# Altium footprint library Intelliclone.PcbLib: 372 footprints (part 1 of 24)
Each footprint in its own frame and in the unit in brackets; x right, y up, seen from the top. Pads: shape width x height; smd on the part's side, far side on the other; paste and mask are expansions set on the pad; w line width, h text height; cw(c..) or ccw(c..) is an arc to the next point about the centre after c.
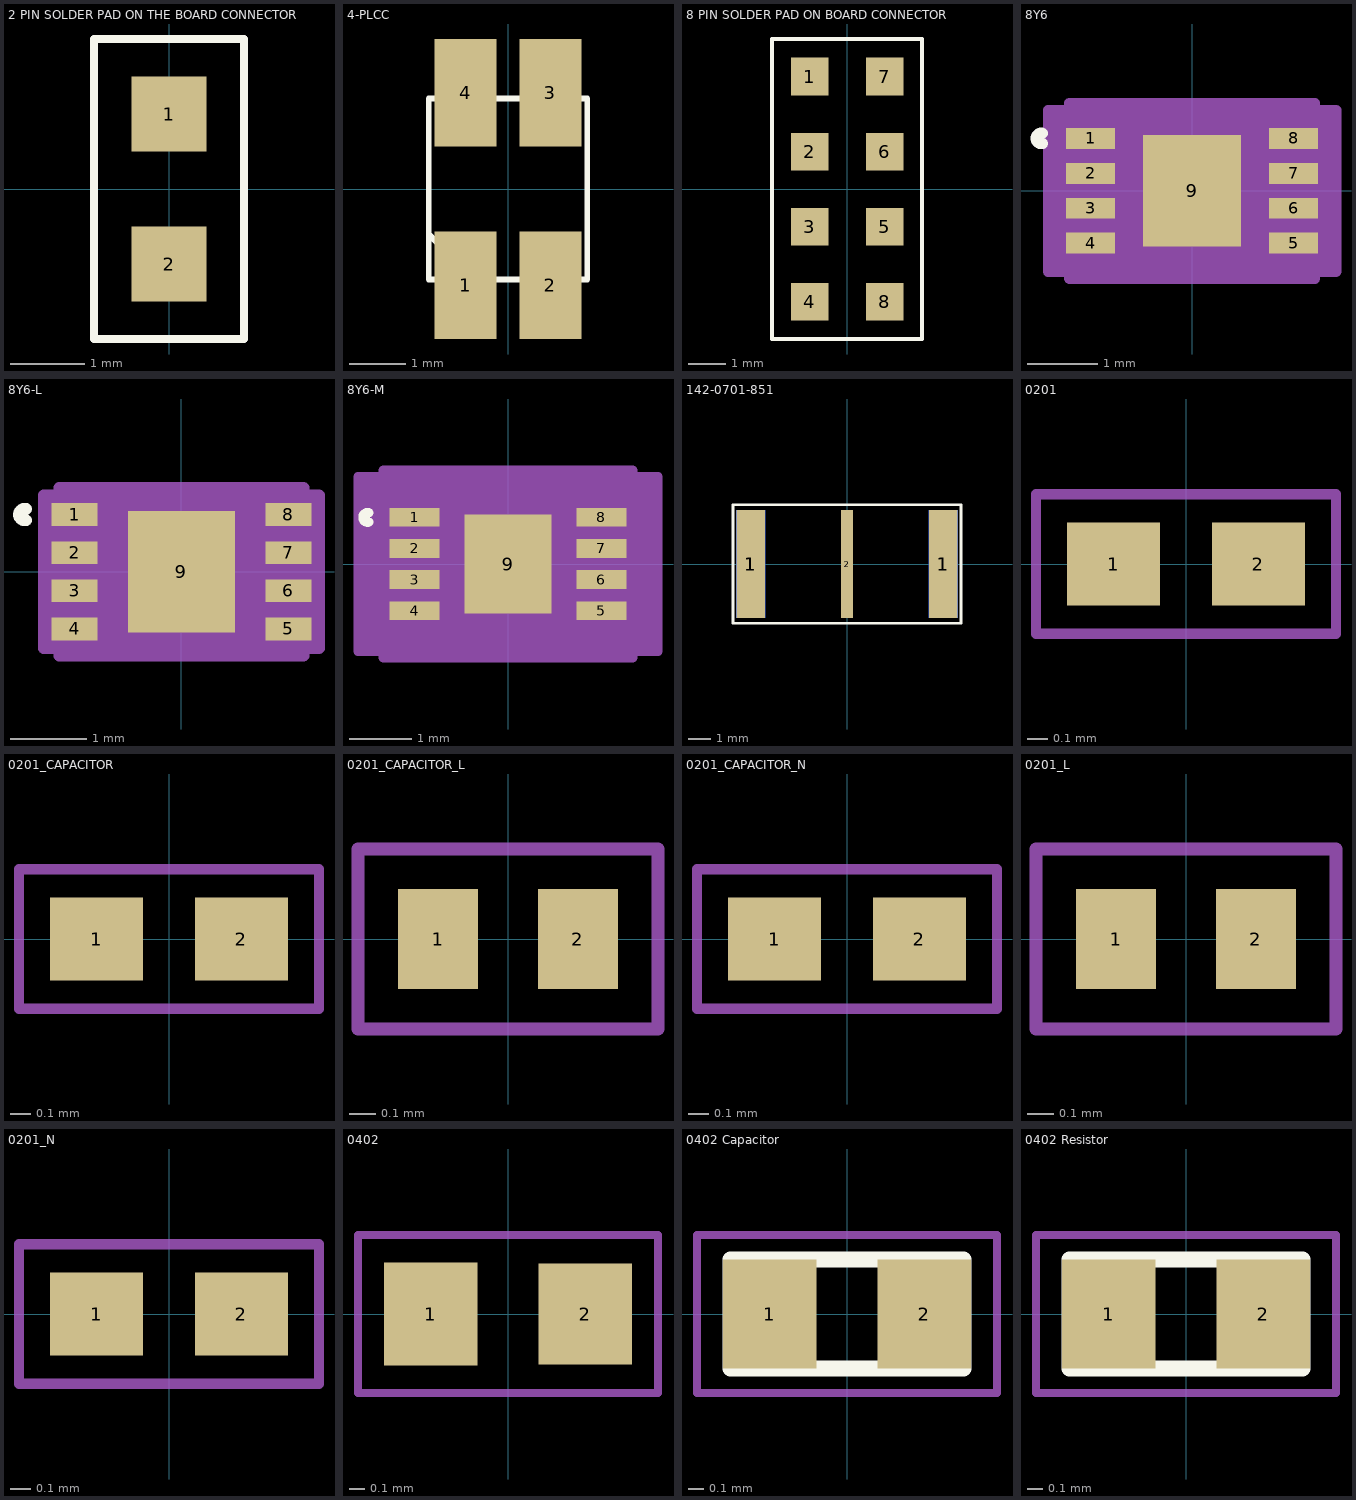
[diagram p0: the footprints below, top view; thin cyan lines are the x and y axes]

## 2 PIN SOLDER PAD ON THE BOARD CONNECTOR [mil]
pads (2):
  rect 40x40 smd: 1(0,40) 2(0,-40)
Top Overlay:
  lines w4.02: -40,-80 -40,80 40,80 40,-80 -40,-80

## 4-PLCC [mm] "4-PLCC LED component package"
height 1.9
pads (4):
  rect 1.1x1.9 smd: 1(-0.75,-1.7) 2(0.75,-1.7) 3(0.75,1.7) 4(-0.75,1.7)
Top Overlay:
  lines w0.1: -1.4,-0.8 -0.6,-1.6 ; -1.4,-1.6 -1.4,1.6 1.4,1.6 1.4,-1.6 -1.4,-1.6
3D body "LED-3-Color-CLV1AFKB.STEP": height 1.92, standoff 0, extent -1.4,-1.6 1.4,1.6

## 8 PIN SOLDER PAD ON BOARD CONNECTOR [mil]
pads (8):
  rect 40x40 smd: 1(-40,120) 2(-40,40) 3(-40,-40) 4(-40,-120) 5(40,-40) 6(40,40) 7(40,120) 8(40,-120)
Top Overlay:
  lines w4.02: -80,-160 80,-160 80,160 -80,160 -80,-160

## 8Y6 [mm]
pads (9):
  rect 0.705x0.3 smd paste+0 mask+0: 1(-1.452,0.75) 2(-1.452,0.25) 3(-1.452,-0.25) 4(-1.452,-0.75) 5(1.452,-0.75) 6(1.452,-0.25) 7(1.452,0.25) 8(1.452,0.75)
  rect 1.4x1.6 smd paste-0.787 mask+0: 9(0,0)
Top Overlay:
  lines w0.152: -2.138,0.676 cw(c-2.156,0.75) -2.138,0.824
Top Paste:
  region: 0.7,0.8 -0.7,0.8 -0.7,-0.8 0.7,-0.8
Mechanical 13:
  circle w0.152: c-1.1,0.75 r0.076
  lines w0: -0.305,1 ccw(c0,1) 0.305,1
  lines w0.025: -1.5,-1 -1.5,1 1.5,1 1.5,-1 -1.5,-1
Mechanical 15:
  region: -1.754,-1.154 -2.059,-1.154 -2.059,1.154 -1.754,1.154 -1.754,1.254 1.754,1.254 1.754,1.154 2.059,1.154 2.059,-1.154 1.754,-1.154 1.754,-1.254 -1.754,-1.254
  lines w0.152: -2.059,-1.154 -1.754,-1.154 -1.754,-1.254 1.754,-1.254 1.754,-1.154 2.059,-1.154 2.059,1.154 1.754,1.154 1.754,1.254 -1.754,1.254 -1.754,1.154 -2.059,1.154 -2.059,-1.154
3D body: height 0.25, standoff 0, extent -1.4,-1.75 -1.4,-1.75
3D body "8Y6.stp": height 0.6, standoff 0, extent -1.5,-1 1.5,1

## 8Y6-L [mm]
pads (9):
  rect 0.603x0.3 smd paste+0 mask+0: 1(-1.402,0.75) 2(-1.402,0.25) 3(-1.402,-0.25) 4(-1.402,-0.75) 5(1.402,-0.75) 6(1.402,-0.25) 7(1.402,0.25) 8(1.402,0.75)
  rect 1.4x1.6 smd paste-0.787 mask+0: 9(0,0)
Top Overlay:
  lines w0.152: -2.036,0.676 cw(c-2.055,0.75) -2.036,0.824
Top Paste:
  region: 0.7,0.8 -0.7,0.8 -0.7,-0.8 0.7,-0.8
Mechanical 13:
  circle w0.152: c-1.1,0.75 r0.076
  lines w0: -0.305,1 ccw(c0,1) 0.305,1
  lines w0.025: -1.5,-1 -1.5,1 1.5,1 1.5,-1 -1.5,-1
Mechanical 15:
  region: -1.602,-1.002 -1.805,-1.002 -1.805,1.002 -1.602,1.002 -1.602,1.102 1.602,1.102 1.602,1.002 1.805,1.002 1.805,-1.002 1.602,-1.002 1.602,-1.102 -1.602,-1.102
  lines w0.152: -1.805,-1.002 -1.602,-1.002 -1.602,-1.102 1.602,-1.102 1.602,-1.002 1.805,-1.002 1.805,1.002 1.602,1.002 1.602,1.102 -1.602,1.102 -1.602,1.002 -1.805,1.002 -1.805,-1.002
3D body: height 0.25, standoff 0, extent 0,0 0.254,0.254
3D body "8Y6-L.stp": height 0.6, standoff 0, extent -1.5,-1 1.5,1

## 8Y6-M [mm]
pads (9):
  rect 0.806x0.3 smd paste+0 mask+0: 1(-1.503,0.75) 2(-1.503,0.25) 3(-1.503,-0.25) 4(-1.503,-0.75) 5(1.503,-0.75) 6(1.503,-0.25) 7(1.503,0.25) 8(1.503,0.75)
  rect 1.4x1.6 smd paste-0.787 mask+0: 9(0,0)
Top Overlay:
  lines w0.152: -2.239,0.676 cw(c-2.258,0.75) -2.239,0.824
Top Paste:
  region: 0.7,0.8 -0.7,0.8 -0.7,-0.8 0.7,-0.8
Mechanical 13:
  circle w0.152: c-1.1,0.75 r0.076
  lines w0: -0.305,1 ccw(c0,1) 0.305,1
  lines w0.025: -1.5,-1 -1.5,1 1.5,1 1.5,-1 -1.5,-1
Mechanical 15:
  region: -2.008,-1.408 -2.414,-1.408 -2.414,1.408 -2.008,1.408 -2.008,1.508 2.008,1.508 2.008,1.408 2.414,1.408 2.414,-1.408 2.008,-1.408 2.008,-1.508 -2.008,-1.508
  lines w0.152: -2.414,-1.408 -2.008,-1.408 -2.008,-1.508 2.008,-1.508 2.008,-1.408 2.414,-1.408 2.414,1.408 2.008,1.408 2.008,1.508 -2.008,1.508 -2.008,1.408 -2.414,1.408 -2.414,-1.408
3D body "8Y6-M.stp": height 0.6, standoff 0, extent -1.5,-1 1.5,1

## 142-0701-851 [mil] "CONN JACK END LAUNCH PC GOLD SMA"
pads (5):
  rect 50x187.01 smd: 1(-167.32,0) 1(167.32,0)
  rect 50x187.01 smd far side: 1(-167.32,0) 1(167.32,0)
  rect 20x187.01 smd: 2(0,0)
Top Overlay:
  lines w5: -198,-103 198,-103 ; -198,-103 -198,103 ; -198,-103 -198,103 ; -198,-103 198,-103 ; -198,103 198,103 ; -198,103 198,103 ; 198,-103 198,103 ; 198,-103 198,103
3D body: height 20, standoff 4, extent -10,-94 10,94
3D body: height 40, standoff 4, extent -192,-94 -142,94
3D body: height 40, standoff 4, extent 142,-94 192,94
3D body: height 83, standoff 4, extent -192,-94 -142,94
3D body: height 83, standoff 4, extent 142,-94 192,94

## 0201 [mil] "0201 IPC Nominal Footprint"
height 9.84
pads (2):
  rect 18x16 smd mask+1: 1(-14,0) 2(14,0)
Mechanical 15:
  lines w2: -29,-13.5 29,-13.5 29,13.5 -29,13.5 -29,-13.5
3D body "RES0201.stp": height 11.81, standoff 0, extent -11.81,-5.9 11.81,5.91

## 0201_CAPACITOR [mil] "0201 IPC Nominal Footprint"
height 9.84
pads (2):
  rect 18x16 smd mask+1: 1(-14,0) 2(14,0)
Mechanical 15:
  lines w2: -29,-13.5 29,-13.5 29,13.5 -29,13.5 -29,-13.5
3D body "CAP 0201.STEP": height 11.91, standoff 0.09, extent -11.81,-6 11.81,5.81

## 0201_CAPACITOR_L [mil] "0201 Least Capacitor Footprint"
height 11.81
pads (2):
  rect 12x15 smd mask+1: 1(-10.5,0) 2(10.5,0)
Top Paste:
  circle w9.61: c-11,0 r0.39
  circle w9.61: c11,0 r0.39
Mechanical 15:
  lines w2: -22.5,-13.5 22.5,-13.5 22.5,13.5 -22.5,13.5 -22.5,-13.5
3D body: height 11.81, standoff 4, extent -11.81,-5.91 11.81,5.91

## 0201_CAPACITOR_N [mil] "0201 IPC Nominal Footprint"
height 9.84
pads (2):
  rect 18x16 smd mask+1: 1(-14,0) 2(14,0)
Mechanical 15:
  lines w2: -29,-13.5 29,-13.5 29,13.5 -29,13.5 -29,-13.5
3D body: height 11.81, standoff 4, extent -11.81,-5.91 11.81,5.91

## 0201_L [mil] "0201 Least Footprint"
height 9.84
pads (2):
  rect 12x15 smd paste-39.37 mask+1.97: 1(-10.5,0)
  rect 12x15 smd paste-3.94 mask+1.97: 2(10.5,0)
Top Paste:
  circle w9.61: c-11,0 r0.39
  circle w9.61: c11,0 r0.39
Top Solder:
  rectangle: -16.73,-7.87 16.73,7.87
Mechanical 15:
  lines w2: -22.5,-13.5 22.5,-13.5 22.5,13.5 -22.5,13.5 -22.5,-13.5
3D body "RES0201.stp": height 11.81, standoff 0, extent -11.81,-5.9 11.81,5.91

## 0201_N [mil] "0201 IPC Nominal Footprint"
height 9.84
pads (2):
  rect 18x16 smd mask+1: 1(-14,0) 2(14,0)
Mechanical 15:
  lines w2: -29,-13.5 -29,13.5 29,13.5 29,-13.5 -29,-13.5
3D body "RES0201.stp": height 11.81, standoff 0, extent -11.81,-5.9 11.81,5.91

## 0402 [mm] "0402 Standard Footprint"
height 5.33
pads (2):
  rect 0.6x0.66 smd: 1(-0.497,0)
  rect 0.6x0.65 smd: 2(0.497,0)
Mechanical 15:
  lines w0.051: -0.965,-0.508 -0.965,0.508 0.965,0.508 0.965,-0.508 -0.965,-0.508
3D body "RES0402.stp": height 0.3, standoff 0, extent -0.513,-0.25 0.487,0.25

## 0402 Capacitor [mm]
height 5.33
pads (2):
  rect 0.599x0.7 smd: 1(-0.497,0) 2(0.497,0)
Top Overlay:
  lines w0.102: -0.75,-0.35 0.75,-0.35 0.75,0.35 -0.75,0.35 -0.75,-0.35
Mechanical 15:
  lines w0.051: -0.965,-0.508 0.965,-0.508 0.965,0.508 -0.965,0.508 -0.965,-0.508
3D body "CAP 0402.STEP": height 0.52, standoff -0.01, extent -0.5,-0.254 0.5,0.27

## 0402 Resistor [mm]
height 5.33
pads (2):
  rect 0.599x0.7 smd: 1(-0.497,0) 2(0.497,0)
Top Overlay:
  lines w0.102: -0.75,-0.35 0.75,-0.35 0.75,0.35 -0.75,0.35 -0.75,-0.35
Mechanical 15:
  lines w0.051: -0.965,-0.508 0.965,-0.508 0.965,0.508 -0.965,0.508 -0.965,-0.508
3D body "RES0402.stp": height 0.3, standoff 0, extent -0.513,-0.25 0.487,0.25